# Altium footprint library Miscellaneous SMD.PcbLib: 82 footprints (part 5 of 7)
Each footprint in its own frame and in the unit in brackets; x right, y up, seen from the top. Pads: shape width x height; smd on the part's side, far side on the other; paste and mask are expansions set on the pad; w line width, h text height; cw(c..) or ccw(c..) is an arc to the next point about the centre after c.
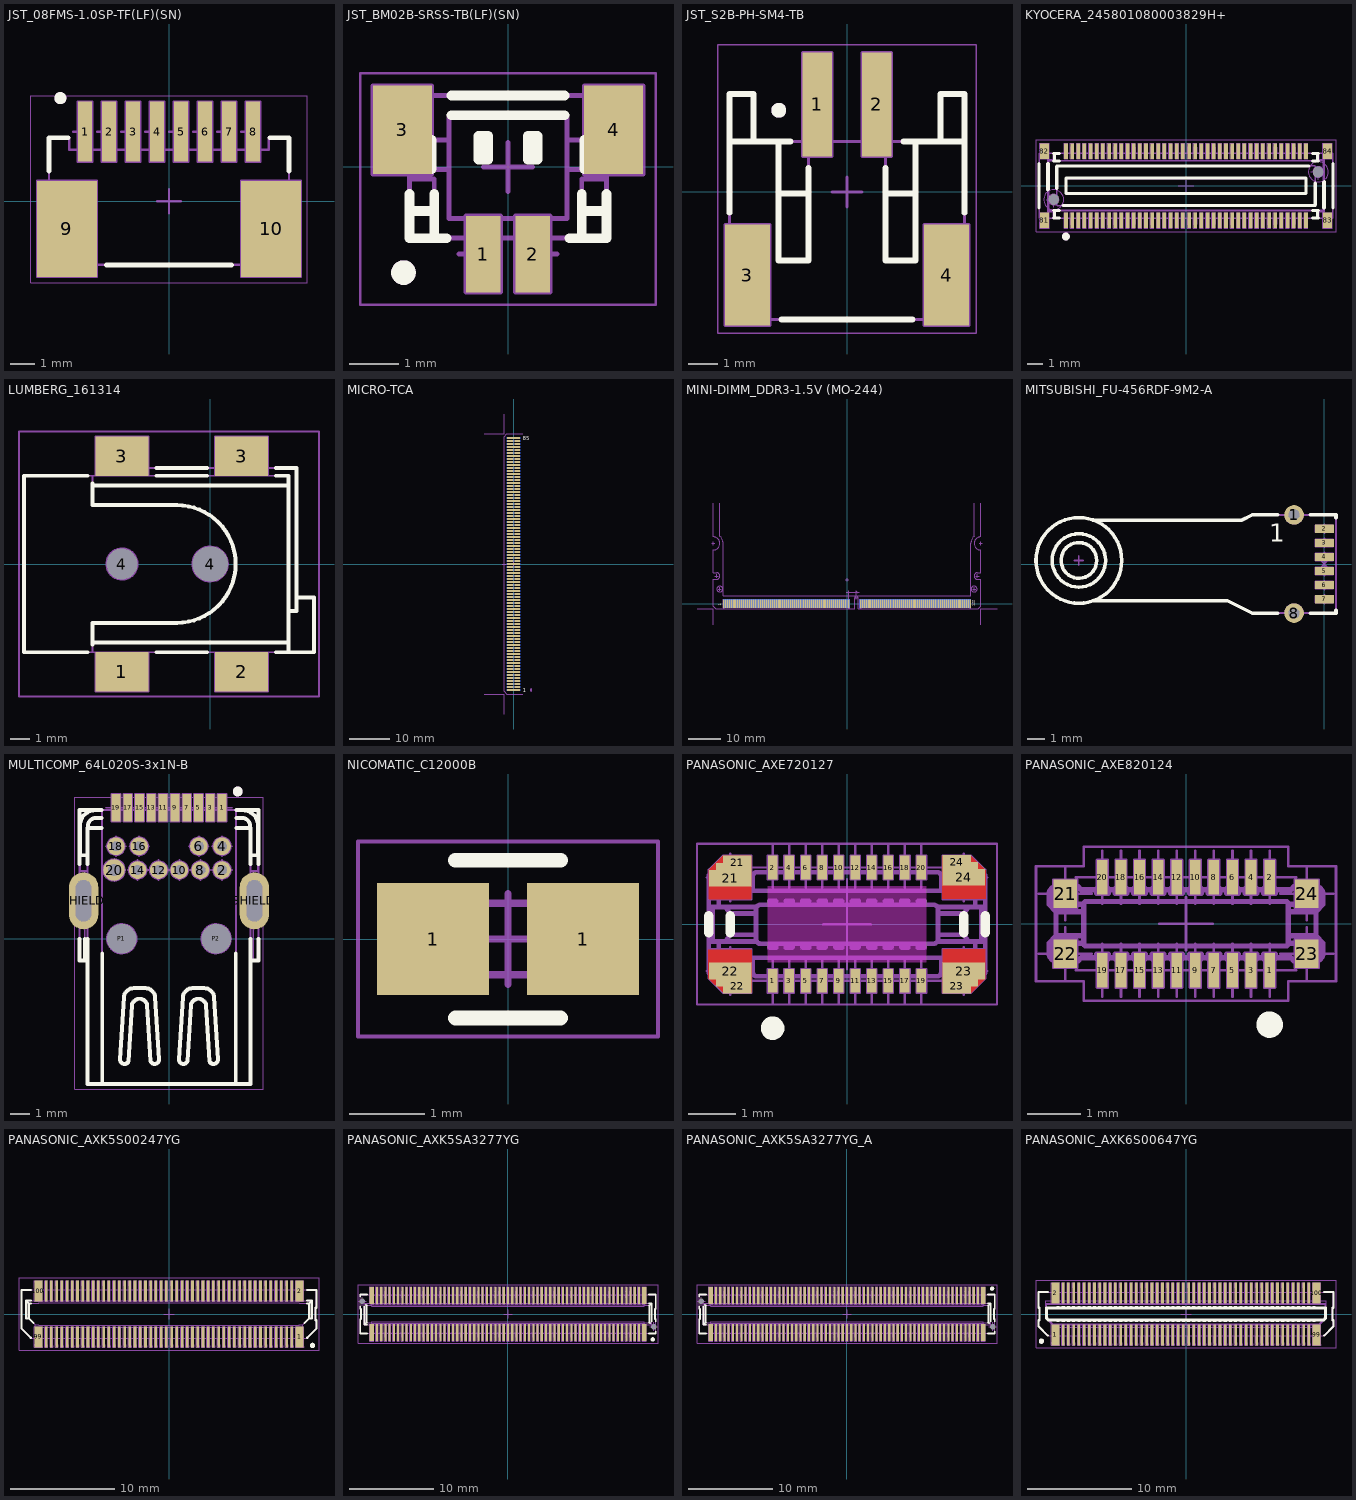
[diagram p4: the footprints below, top view; thin cyan lines are the x and y axes]

## JST_08FMS-1.0SP-TF(LF)(SN) [mm] "1.0mm Pitch, 8 Contacts, FSM Connector for FCC, Body 10mm x 5.3mm"
height 2.8
pads (10):
  rect 0.6x2.5 smd: 1(-3.5,2.9) 2(-2.5,2.9) 3(-1.5,2.9) 4(-0.5,2.9) 5(0.5,2.9) 6(1.5,2.9) 7(2.5,2.9) 8(3.5,2.9)
  rect 2.5x4 smd: 9(-4.25,-1.15) 10(4.25,-1.15)
Top Overlay:
  circle w0.25: c-4.525,4.3 r0.125
  lines w0.2: -5,1.25 -5,2.65 -4.2,2.65 ; -2.6,-2.65 2.6,-2.65 ; 4.2,2.65 5,2.65 5,1.25
Mechanical 8:
  lines w0.1: -4.75,-1.15 -4.25,-1.15 ; -4.25,-1.65 -4.25,-1.15 ; -4.25,-0.65 -4.25,-1.15 ; -4,2.9 -3.5,2.9 ; -3.75,-1.15 -4.25,-1.15 ; -3.5,2.4 -3.5,2.9 ; -3.5,3.4 -3.5,2.9 ; -3,2.9 -2.5,2.9 ; -2.5,2.4 -2.5,2.9 ; -2.5,3.4 -2.5,2.9 ; -2,2.9 -1.5,2.9 ; -1.5,2.4 -1.5,2.9 ; -1.5,3.4 -1.5,2.9 ; -1,2.9 -0.5,2.9 ; -0.5,0 0,0 ; -0.5,2.4 -0.5,2.9 ; -0.5,3.4 -0.5,2.9 ; 0,-0.5 0,0 ; 0,0.5 0,0 ; 0,2.9 0.5,2.9 ; 0.5,0 0,0 ; 0.5,2.4 0.5,2.9 ; 0.5,3.4 0.5,2.9 ; 1,2.9 1.5,2.9 ; 1.5,2.4 1.5,2.9 ; 1.5,3.4 1.5,2.9 ; 2,2.9 2.5,2.9 ; 2.5,2.4 2.5,2.9 ; 2.5,3.4 2.5,2.9 ; 3,2.9 3.5,2.9 ; 3.5,2.4 3.5,2.9 ; 3.5,3.4 3.5,2.9 ; 3.75,-1.15 4.25,-1.15 ; 4.25,-1.65 4.25,-1.15 ; 4.25,-0.65 4.25,-1.15 ; 4.75,-1.15 4.25,-1.15 ; -5.5,-3.15 -3,-3.15 -3,0.85 -5.5,0.85 -5.5,-3.15 ; -3.8,1.65 -3.8,4.15 -3.2,4.15 -3.2,1.65 -3.8,1.65 ; -2.8,1.65 -2.8,4.15 -2.2,4.15 -2.2,1.65 -2.8,1.65 ; -1.8,1.65 -1.8,4.15 -1.2,4.15 -1.2,1.65 -1.8,1.65 ; -0.8,1.65 -0.8,4.15 -0.2,4.15 -0.2,1.65 -0.8,1.65 ; 0.2,1.65 0.2,4.15 0.8,4.15 0.8,1.65 0.2,1.65 ; 1.2,1.65 1.2,4.15 1.8,4.15 1.8,1.65 1.2,1.65 ; 2.2,1.65 2.2,4.15 2.8,4.15 2.8,1.65 2.2,1.65 ; 3,-3.15 5.5,-3.15 5.5,0.85 3,0.85 3,-3.15 ; 3.2,1.65 3.2,4.15 3.8,4.15 3.8,1.65 3.2,1.65
Mechanical 14:
  circle w0.25: c-4.525,4.3 r0.125
  lines w0.1: -5,0.35 -3.5,0.35 -3.5,-2.65 ; -3.65,2.15 -3.65,3.65 -3.35,3.65 -3.35,2.15 ; -2.65,2.15 -2.65,3.65 -2.35,3.65 -2.35,2.15 ; -1.65,2.15 -1.65,3.65 -1.35,3.65 -1.35,2.15 ; -0.65,2.15 -0.65,3.65 -0.35,3.65 -0.35,2.15 ; 0.35,2.15 0.35,3.65 0.65,3.65 0.65,2.15 ; 1.35,2.15 1.35,3.65 1.65,3.65 1.65,2.15 ; 2.35,2.15 2.35,3.65 2.65,3.65 2.65,2.15 ; 3.35,2.15 3.35,3.65 3.65,3.65 3.65,2.15 ; 3.5,-2.65 3.5,0.35 5,0.35 ; -5,-2.65 5,-2.65 5,2.65 4.15,2.65 4.15,2.15 -4.15,2.15 -4.15,2.65 -5,2.65 -5,-2.65
Mechanical 15:
  lines w0.05: -5.75,-3.4 5.75,-3.4 5.75,4.4 -5.75,4.4 -5.75,-3.4
3D body "JST_08FMS-1.0SP-TF(LF)(SN).stp": height 2.8, standoff 0, extent -5,-2.65 5,3.65

## JST_BM02B-SRSS-TB(LF)(SN) [mm] "1.0mm Pitch Disconnectable Crimp Style Connector, Body 4mm x 2.9mm"
height 4.25
pads (4):
  rect 0.7x1.55 smd: 1(-0.5,-1.775) 2(0.5,-1.775)
  rect 1.2x1.8 smd: 3(-2.15,0.75) 4(2.15,0.75)
Top Overlay:
  circle w0.25: c-2.125,-2.15 r0.125
  lines w0.2: -2,-0.9 -1.5,-0.9 ; -2,-0.55 -2,-1.45 -1.25,-1.45 ; -1.55,-0.05 -1.55,0.55 ; -1.5,-1.45 -1.5,-0.55 ; -1.15,1.05 1.15,1.05 ; -1.15,1.45 1.15,1.45 ; -0.6,0.28 -0.4,0.28 ; 0.4,0.28 0.6,0.28 ; 1.25,-1.45 2,-1.45 2,-0.55 ; 1.5,-1.45 1.5,-0.55 ; 1.5,-0.9 2,-0.9 ; 1.55,-0.05 1.55,0.55 ; -0.6,0.15 -0.4,0.15 -0.4,0.63 -0.6,0.63 -0.6,0.15 ; 0.4,0.15 0.6,0.15 0.6,0.63 0.4,0.63 0.4,0.15
Mechanical 8:
  lines w0.1: -2.65,0.75 -2.15,0.75 ; -2.15,0.25 -2.15,0.75 ; -2.15,1.25 -2.15,0.75 ; -1.65,0.75 -2.15,0.75 ; -1,-1.775 -0.5,-1.775 ; -0.5,-2.275 -0.5,-1.775 ; -0.5,-1.275 -0.5,-1.775 ; -0.5,0 0,0 ; 0,-0.5 0,0 ; 0,0.5 0,0 ; 0.5,-2.275 0.5,-1.775 ; 0.5,-1.275 0.5,-1.775 ; 0.5,0 0,0 ; 1,-1.775 0.5,-1.775 ; 1.65,0.75 2.15,0.75 ; 2.15,0.25 2.15,0.75 ; 2.15,1.25 2.15,0.75 ; 2.65,0.75 2.15,0.75 ; -2.75,-0.15 -2.75,1.65 -1.55,1.65 -1.55,-0.15 -2.75,-0.15 ; -0.85,-2.55 -0.85,-1 -0.15,-1 -0.15,-2.55 -0.85,-2.55 ; 0.15,-2.55 0.15,-1 0.85,-1 0.85,-2.55 0.15,-2.55 ; 1.55,-0.15 1.55,1.65 2.75,1.65 2.75,-0.15 1.55,-0.15
Mechanical 14:
  circle w0.25: c-2.125,-2.15 r0.125
  lines w0.1: -2,-0.9 -1.5,-0.9 ; -2,-0.25 -1.5,-0.25 -1.5,-1.45 ; -1.2,-0.05 -1.55,-0.05 -1.55,0.55 -1.2,0.55 ; -0.6,-1.45 -0.6,-2.15 -0.4,-2.15 -0.4,-1.45 ; -0.6,0.28 -0.4,0.28 ; 0.4,-1.45 0.4,-2.15 0.6,-2.15 0.6,-1.45 ; 0.4,0.28 0.6,0.28 ; 1.2,-0.05 1.55,-0.05 1.55,0.55 1.2,0.55 ; 1.5,-1.45 1.5,-0.25 2,-0.25 ; 1.5,-0.9 2,-0.9 ; -2,-1.45 -2,1.45 2,1.45 2,-1.45 -2,-1.45 ; -1.2,-1.05 -1.2,1.05 1.2,1.05 1.2,-1.05 -1.2,-1.05 ; -0.6,0.15 -0.4,0.15 -0.4,0.63 -0.6,0.63 -0.6,0.15 ; 0.4,0.15 0.6,0.15 0.6,0.63 0.4,0.63 0.4,0.15
Mechanical 15:
  lines w0.05: -3,-2.8 3,-2.8 3,1.9 -3,1.9 -3,-2.8
3D body "JST_BM02B-SRSS-TB(LF)(SN).stp": height 4.32, standoff 0, extent -2,-2.15 2,1.45

## JST_S2B-PH-SM4-TB [mm] "2.0mm Pitch Disconnectable Crimp Style Connector, Body 7.9mm x 8.6mm"
height 5.5
pads (4):
  rect 1x3.5 smd: 1(-1,2.95) 2(1,2.95)
  rect 1.5x3.4 smd: 3(-3.35,-2.8) 4(3.35,-2.8)
Top Overlay:
  circle w0.25: c-2.3,2.75 r0.125
  lines w0.2: -3.95,-0.7 -3.95,3.3 -3.15,3.3 -3.15,1.7 ; -3.95,1.7 -1.9,1.7 ; -2.3,-0.05 -1.3,-0.05 ; -2.3,1.7 -2.3,-2.3 -1.3,-2.3 -1.3,0.8 ; -2.2,-4.3 2.2,-4.3 ; 1.3,-0.05 2.3,-0.05 ; 1.3,0.8 1.3,-2.3 2.3,-2.3 2.3,1.7 ; 1.9,1.7 3.95,1.7 ; 3.15,1.7 3.15,3.3 3.95,3.3 3.95,-0.7
Mechanical 8:
  lines w0.1: -3.85,-2.8 -3.35,-2.8 ; -3.35,-3.3 -3.35,-2.8 ; -3.35,-2.3 -3.35,-2.8 ; -2.85,-2.8 -3.35,-2.8 ; -1.5,2.95 -1,2.95 ; -1,2.45 -1,2.95 ; -1,3.45 -1,2.95 ; -0.5,0 0,0 ; -0.5,2.95 -1,2.95 ; 0,-0.5 0,0 ; 0,0.5 0,0 ; 0.5,0 0,0 ; 0.5,2.95 1,2.95 ; 1,2.45 1,2.95 ; 1,3.45 1,2.95 ; 1.5,2.95 1,2.95 ; 2.85,-2.8 3.35,-2.8 ; 3.35,-3.3 3.35,-2.8 ; 3.35,-2.3 3.35,-2.8 ; 3.85,-2.8 3.35,-2.8 ; -4.1,-4.5 -2.6,-4.5 -2.6,-1.1 -4.1,-1.1 -4.1,-4.5 ; -1.5,1.2 -1.5,4.7 -0.5,4.7 -0.5,1.2 -1.5,1.2 ; 0.5,1.2 0.5,4.7 1.5,4.7 1.5,1.2 0.5,1.2 ; 2.6,-4.5 4.1,-4.5 4.1,-1.1 2.6,-1.1 2.6,-4.5
Mechanical 14:
  circle w0.25: c-2.3,2.75 r0.125
  lines w0.1: -3.95,1.7 3.95,1.7 ; -3.45,-3.5 -3.45,-4.3 3.45,-4.3 3.45,-3.5 ; -3.15,1.7 -3.15,3.3 -3.95,3.3 -3.95,-3.5 -3.05,-3.5 -3.05,-4.3 ; -2.3,-0.05 -1.3,-0.05 ; -2.3,1.7 -2.3,-2.3 -1.3,-2.3 -1.3,1.7 ; -1.25,1.7 -1.25,4.3 -0.75,4.3 -0.75,1.7 ; 0.75,1.7 0.75,4.3 1.25,4.3 1.25,1.7 ; 1.3,-0.05 2.3,-0.05 ; 1.3,1.7 1.3,-2.3 2.3,-2.3 2.3,1.7 ; 3.05,-4.3 3.05,-3.5 3.95,-3.5 3.95,3.3 3.15,3.3 3.15,1.7
Mechanical 15:
  lines w0.05: -4.35,-4.75 -4.35,4.95 4.35,4.95 4.35,-4.75 -4.35,-4.75
3D body "JST_S2B-PH-SM4-TB.stp": height 5.6, standoff 0, extent -3.95,-4.3 3.95,4.3

## KYOCERA_245801080003829H+ [mm] "80 Contacts, Receptacle Vertical SMT, 0.4mm Pitch Board to Board Connector, With Metal Tab and Boss, 5801 Series"
height 0.85
pads (86):
  rect 0.23x1 smd: 1(-7.8,-2.25) 2(-7.8,2.25) 3(-7.4,-2.25) 4(-7.4,2.25) 5(-7,-2.25) 6(-7,2.25) 7(-6.6,-2.25) 8(-6.6,2.25) 9(-6.2,-2.25) 10(-6.2,2.25) 11(-5.8,-2.25) 12(-5.8,2.25) 13(-5.4,-2.25) 14(-5.4,2.25) 15(-5,-2.25) 16(-5,2.25) 17(-4.6,-2.25) 18(-4.6,2.25) 19(-4.2,-2.25) 20(-4.2,2.25) 21(-3.8,-2.25) 22(-3.8,2.25) 23(-3.4,-2.25) 24(-3.4,2.25) 25(-3,-2.25) 26(-3,2.25) 27(-2.6,-2.25) 28(-2.6,2.25) 29(-2.2,-2.25) 30(-2.2,2.25) 31(-1.8,-2.25) 32(-1.8,2.25) 33(-1.4,-2.25) 34(-1.4,2.25) 35(-1,-2.25) 36(-1,2.25) 37(-0.6,-2.25) 38(-0.6,2.25) 39(-0.2,-2.25) 40(-0.2,2.25) 41(0.2,-2.25) 42(0.2,2.25) 43(0.6,-2.25) 44(0.6,2.25) 45(1,-2.25) 46(1,2.25) 47(1.4,-2.25) 48(1.4,2.25) 49(1.8,-2.25) 50(1.8,2.25) 51(2.2,-2.25) 52(2.2,2.25) 53(2.6,-2.25) 54(2.6,2.25) 55(3,-2.25) 56(3,2.25) 57(3.4,-2.25) 58(3.4,2.25) 59(3.8,-2.25) 60(3.8,2.25) 61(4.2,-2.25) 62(4.2,2.25) 63(4.6,-2.25) 64(4.6,2.25) 65(5,-2.25) 66(5,2.25) 67(5.4,-2.25) 68(5.4,2.25) 69(5.8,-2.25) 70(5.8,2.25) 71(6.2,-2.25) 72(6.2,2.25) 73(6.6,-2.25) 74(6.6,2.25) 75(7,-2.25) 76(7,2.25) 77(7.4,-2.25) 78(7.4,2.25) 79(7.8,-2.25) 80(7.8,2.25)
  rect 0.6x1 smd: 81(-9.2,-2.25) 82(-9.2,2.25) 83(9.2,-2.25) 84(9.2,2.25)
  round 0.5 hole 0.7 unplated mask+0.1: P1(-8.6,-0.9) P2(8.6,0.9)
Top Overlay:
  circle w0.25: c-7.8,-3.3 r0.125
  lines w0.2: -9.55,-1.45 -9.55,1.45 ; -8.995,-0.284 -8.995,1.45 ; -8.925,-0.237 -8.925,1.45 ; -8.6,-2.1 -8.215,-2.1 ; -8.6,-1.61 -8.215,-1.61 ; -8.6,1.61 -8.215,1.61 ; -8.6,2.1 -8.215,2.1 ; -8.55,-2.1 -8.55,-1.61 ; -8.55,1.61 -8.55,2.1 ; -8.4,-0.182 -8.4,1.24 cw(c-8.35,1.24) -8.35,1.29 7.98,1.29 ; -7.98,-1.29 8.35,-1.29 ccw(c8.348,-1.238) 8.4,-1.24 8.4,0.182 ; 8.215,-2.1 8.6,-2.1 ; 8.215,-1.61 8.6,-1.61 ; 8.215,1.61 8.6,1.61 ; 8.215,2.1 8.6,2.1 ; 8.55,-2.1 8.55,-1.61 ; 8.55,1.61 8.55,2.1 ; 8.925,-1.45 8.925,0.237 ; 8.995,-1.45 8.995,0.284 ; 9.55,-1.45 9.55,1.45 ; -7.8,-0.51 -7.8,0.51 7.8,0.51 7.8,-0.51 -7.8,-0.51
Mechanical 8:
  drawing of 516 lines, arcs and shapes, not listed
  text "79" at 7.616,-2.375 h0.2
  text "77" at 7.225,-2.375 h0.2
  text "78" at 7.225,2.125 h0.2
  text "80" at 7.625,2.125 h0.2
  text "4" at -7.5,2.125 h0.2
  text "2" at -7.892,2.125 h0.2
  text "3" at -7.493,-2.375 h0.2
  text "1" at -7.862,-2.375 h0.2
Mechanical 14:
  drawing of 297 lines, arcs and shapes, not listed
Mechanical 15:
  lines w0.05: -9.75,-3 -9.75,3 9.75,3 9.75,-3 -9.75,-3
3D body "KYOCERA_245801080003829H+.stp": height 0.75, standoff -0.33, extent -9.55,-2.5 9.55,2.5

## LUMBERG_161314 [mm] "Right Angle Surface Mount Power Supply Chassis Socket With Break Contacts"
height 11
pads (6):
  rect 2.7x2 smd: 1(-4.5,-5.5) 2(1.6,-5.5) 3(-4.5,5.5) 3(1.6,5.5)
  round 1 hole 1.6 unplated mask+0.3: 4(-4.5,0)
  round 1 hole 1.8 unplated mask+0.4: 4(0,0)
Top Overlay:
  lines w0.2: -6.25,-4.5 -9.5,-4.5 -9.5,4.5 -6.25,4.5 ; -6,-4.1 -6,-3 -1.7,-3 ccw(c-1.7,0) -1.7,3 -6,3 -6,4.1 ; -6,-4 4,-4 ; -6,4 4,4 ; -2.75,-4.5 -0.15,-4.5 ; -2.75,4.5 -0.15,4.5 ; -2.75,4.9 -0.15,4.9 ; 3.35,-4.5 4,-4.5 ; 3.35,4.5 4,4.5 4,-4.5 ; 3.35,4.9 4.4,4.9 4.4,-2.4 4,-2.4 ; 4.4,-1.7 5.3,-1.7 5.3,-4.5 4,-4.5
Mechanical 8:
  circle w0.1: c0,0 r0.9
  circle w0.1: c-4.5,0 r0.8
  lines w0.1: -5,-5.5 -4.5,-5.5 ; -5,0 -4.5,0 ; -5,5.5 -4.5,5.5 ; -4.5,-6 -4.5,-5.5 ; -4.5,-5 -4.5,-5.5 ; -4.5,-0.5 -4.5,0 ; -4.5,0.5 -4.5,0 ; -4.5,5 -4.5,5.5 ; -4.5,6 -4.5,5.5 ; -4,-5.5 -4.5,-5.5 ; -4,0 -4.5,0 ; -4,5.5 -4.5,5.5 ; -0.5,0 0,0 ; 0,-0.5 0,0 ; 0,0.5 0,0 ; 0.5,0 0,0 ; 1.1,-5.5 1.6,-5.5 ; 1.1,5.5 1.6,5.5 ; 1.6,-6 1.6,-5.5 ; 1.6,-5 1.6,-5.5 ; 1.6,5 1.6,5.5 ; 1.6,6 1.6,5.5 ; 2.1,-5.5 1.6,-5.5 ; 2.1,5.5 1.6,5.5 ; -5.85,-6.5 -5.85,-4.5 -3.15,-4.5 -3.15,-6.5 -5.85,-6.5 ; -5.85,4.5 -3.15,4.5 -3.15,6.5 -5.85,6.5 -5.85,4.5 ; 0.25,-6.5 2.95,-6.5 2.95,-4.5 0.25,-4.5 0.25,-6.5 ; 0.25,4.5 2.95,4.5 2.95,6.5 0.25,6.5 0.25,4.5
Mechanical 14:
  lines w0.1: -6,-4.5 -6,-3 -1.7,-3 ccw(c-1.7,0) -1.7,3 -6,3 -6,4.5 ; -6,-4 4,-4 ; -6,4 4,4 ; -5.25,-4.9 -3.75,-4.9 ; -5.25,-4.5 -5.25,-6.3 -3.75,-6.3 -3.75,-4.5 ; -5.25,4.5 -5.25,6.3 -3.75,6.3 -3.75,4.9 ; -5.25,4.9 4.4,4.9 4.4,-2.4 4,-2.4 ; 0.85,-4.9 2.35,-4.9 ; 0.85,-4.5 0.85,-6.3 2.35,-6.3 2.35,-4.5 ; 0.85,4.9 0.85,6.3 2.35,6.3 2.35,4.9 ; 4.4,-1.7 5.3,-1.7 5.3,-4.5 4,-4.5 ; 4,-4.5 -9.5,-4.5 -9.5,4.5 4,4.5 4,-4.5
Mechanical 15:
  lines w0.1: -9.75,-6.75 -9.75,6.75 5.55,6.75 5.55,-6.75 -9.75,-6.75
3D body "LUMBERG_161314.stp": height 11, standoff -1.2, extent -9.5,-6.3 5.3,6.3

## MICRO-TCA [mm] "170 Contact Board Edge Connector,  Micro TCA (Telecom Computing Architecture)"
pads (285):
  rect 3.3x0.48 smd paste-3.3: 1(0,-31.5) 7(0,-27) 10(0,-24.75) 13(0,-22.5) 16(0,-20.25) 19(0,-18) 22(0,-15.75) 25(0,-13.5) 28(0,-11.25) 31(0,-9) 34(0,-6.75) 37(0,-4.5) 40(0,-2.25) 43(0,0) 46(0,2.25) 49(0,4.5) 52(0,6.75) 55(0,9) 58(0,11.25) 61(0,13.5) 64(0,15.75) 67(0,18) 70(0,20.25) 73(0,22.5) 76(0,24.75) 79(0,27) 82(0,29.25) 85(0,31.5)
  rect 1.4x0.48 smd paste-1.4: 2(0.95,-30.75) 3(0.95,-30) 4(0.95,-29.25) 5(0.95,-28.5) 6(0.95,-27.75) 8(0.95,-26.25) 9(0.95,-25.5) 11(0.95,-24) 12(0.95,-23.25) 14(0.95,-21.75) 15(0.95,-21) 17(0.95,-19.5) 18(0.95,-18.75) 20(0.95,-17.25) 21(0.95,-16.5) 23(0.95,-15) 24(0.95,-14.25) 26(0.95,-12.75) 27(0.95,-12) 29(0.95,-10.5) 30(0.95,-9.75) 32(0.95,-8.25) 33(0.95,-7.5) 35(0.95,-6) 36(0.95,-5.25) 38(0.95,-3.75) 39(0.95,-3) 41(0.95,-1.5) 42(0.95,-0.75) 44(0.95,0.75) 45(0.95,1.5) 47(0.95,3) 48(0.95,3.75) 50(0.95,5.25) 51(0.95,6) 53(0.95,7.5) 54(0.95,8.25) 56(0.95,9.75) 57(0.95,10.5) 59(0.95,12) 60(0.95,12.75) 62(0.95,14.25) 63(0.95,15) 65(0.95,16.5) 66(0.95,17.25) 68(0.95,18.75) 69(0.95,19.5) 71(0.95,21) 72(0.95,21.75) 74(0.95,23.25) 75(0.95,24) 77(0.95,25.5) 78(0.95,26.25) 80(0.95,27.75) 81(0.95,28.5) 83(0.95,30) 84(0.95,30.75)
  rect 1.7x0.48 smd paste-1.7: 3mate(-0.8,-30.75) 3mate(-0.8,-30) 3mate(-0.8,-29.25) 3mate(-0.8,-28.5) 3mate(-0.8,-27.75) 3mate(-0.8,-26.25) 3mate(-0.8,-25.5) 3mate(-0.8,-24) 3mate(-0.8,-23.25) 3mate(-0.8,-21.75) 3mate(-0.8,-21) 3mate(-0.8,-19.5) 3mate(-0.8,-18.75) 3mate(-0.8,-17.25) 3mate(-0.8,-16.5) 3mate(-0.8,-15) 3mate(-0.8,-14.25) 3mate(-0.8,-12.75) 3mate(-0.8,-12) 3mate(-0.8,-10.5) 3mate(-0.8,-9.75) 3mate(-0.8,-8.25) 3mate(-0.8,-7.5) 3mate(-0.8,-6) 3mate(-0.8,-5.25) 3mate(-0.8,-3.75) 3mate(-0.8,-3) 3mate(-0.8,-1.5) 3mate(-0.8,-0.75) 3mate(-0.8,0.75) 3mate(-0.8,1.5) 3mate(-0.8,3) 3mate(-0.8,3.75) 3mate(-0.8,5.25) 3mate(-0.8,6) 3mate(-0.8,7.5) 3mate(-0.8,8.25) 3mate(-0.8,9.75) 3mate(-0.8,10.5) 3mate(-0.8,12) 3mate(-0.8,12.75) 3mate(-0.8,14.25) 3mate(-0.8,15) 3mate(-0.8,16.5) 3mate(-0.8,17.25) 3mate(-0.8,18.75) 3mate(-0.8,19.5) 3mate(-0.8,21) 3mate(-0.8,21.75) 3mate(-0.8,23.25) 3mate(-0.8,24) 3mate(-0.8,25.5) 3mate(-0.8,26.25) 3mate(-0.8,27.75) 3mate(-0.8,28.5) 3mate(-0.8,30) 3mate(-0.8,30.75)
  rect 1.7x0.48 smd far side paste-1.7: 3mate(-0.8,-30.75) 3mate(-0.8,-30) 3mate(-0.8,-29.25) 3mate(-0.8,-28.5) 3mate(-0.8,-27.75) 3mate(-0.8,-26.25) 3mate(-0.8,-25.5) 3mate(-0.8,-24) 3mate(-0.8,-23.25) 3mate(-0.8,-21.75) 3mate(-0.8,-21) 3mate(-0.8,-19.5) 3mate(-0.8,-18.75) 3mate(-0.8,-17.25) 3mate(-0.8,-16.5) 3mate(-0.8,-15) 3mate(-0.8,-14.25) 3mate(-0.8,-12.75) 3mate(-0.8,-12) 3mate(-0.8,-10.5) 3mate(-0.8,-9.75) 3mate(-0.8,-8.25) 3mate(-0.8,-7.5) 3mate(-0.8,-6) 3mate(-0.8,-5.25) 3mate(-0.8,-3.75) 3mate(-0.8,-3) 3mate(-0.8,-1.5) 3mate(-0.8,-0.75) 3mate(-0.8,0.75) 3mate(-0.8,1.5) 3mate(-0.8,3) 3mate(-0.8,3.75) 3mate(-0.8,5.25) 3mate(-0.8,6) 3mate(-0.8,7.5) 3mate(-0.8,8.25) 3mate(-0.8,9.75) 3mate(-0.8,10.5) 3mate(-0.8,12) 3mate(-0.8,12.75) 3mate(-0.8,14.25) 3mate(-0.8,15) 3mate(-0.8,16.5) 3mate(-0.8,17.25) 3mate(-0.8,18.75) 3mate(-0.8,19.5) 3mate(-0.8,21) 3mate(-0.8,21.75) 3mate(-0.8,23.25) 3mate(-0.8,24) 3mate(-0.8,25.5) 3mate(-0.8,26.25) 3mate(-0.8,27.75) 3mate(-0.8,28.5) 3mate(-0.8,30) 3mate(-0.8,30.75)
  rect 3.3x0.48 smd far side paste-3.3: 86(0,31.5) 89(0,29.25) 92(0,27) 95(0,24.75) 98(0,22.5) 101(0,20.25) 104(0,18) 107(0,15.75) 110(0,13.5) 113(0,11.25) 116(0,9) 119(0,6.75) 122(0,4.5) 125(0,2.25) 128(0,0) 131(0,-2.25) 134(0,-4.5) 137(0,-6.75) 140(0,-9) 143(0,-11.25) 146(0,-13.5) 149(0,-15.75) 152(0,-18) 155(0,-20.25) 158(0,-22.5) 161(0,-24.75) 164(0,-27) 170(0,-31.5)
  rect 1.4x0.48 smd far side paste-1.4: 87(0.95,30.75) 88(0.95,30) 90(0.95,28.5) 91(0.95,27.75) 93(0.95,26.25) 94(0.95,25.5) 96(0.95,24) 97(0.95,23.25) 99(0.95,21.75) 100(0.95,21) 102(0.95,19.5) 103(0.95,18.75) 105(0.95,17.25) 106(0.95,16.5) 108(0.95,15) 109(0.95,14.25) 111(0.95,12.75) 112(0.95,12) 114(0.95,10.5) 115(0.95,9.75) 117(0.95,8.25) 118(0.95,7.5) 120(0.95,6) 121(0.95,5.25) 123(0.95,3.75) 124(0.95,3) 126(0.95,1.5) 127(0.95,0.75) 129(0.95,-0.75) 130(0.95,-1.5) 132(0.95,-3) 133(0.95,-3.75) 135(0.95,-5.25) 136(0.95,-6) 138(0.95,-7.5) 139(0.95,-8.25) 141(0.95,-9.75) 142(0.95,-10.5) 144(0.95,-12) 145(0.95,-12.75) 147(0.95,-14.25) 148(0.95,-15) 150(0.95,-16.5) 151(0.95,-17.25) 153(0.95,-18.75) 154(0.95,-19.5) 156(0.95,-21) 157(0.95,-21.75) 159(0.95,-23.25) 160(0.95,-24) 162(0.95,-25.5) 163(0.95,-26.25) 165(0.95,-27.75) 166(0.95,-28.5) 167(0.95,-29.25) 168(0.95,-30) 169(0.95,-30.75)
  rect 1.4x0.48 on Bottom Solder paste-1.4: 138(0.95,-7.5)
Top Overlay:
  text "85" at 2.271,30.961 h1
  text "1" at 2.271,-32.039 h1
Bottom Overlay:
  text "86" at 2.275,31.95 h1
  text "170" at 2.275,-31.05 h1
Top Solder:
  rectangle: -2.35,-32.5 2.35,32.5
Bottom Solder:
  rectangle: -2.35,-32.5 2.35,32.5
Mechanical 8:
  lines w0.1: -7.35,-32.5 -2.35,-32.5 -2.35,-37.5 ; -7.35,32.5 -2.35,32.5 -2.35,37.5 ; -2.85,0 -2.35,0 ; -1.85,0 -2.35,0 ; -0.5,0 0,0 ; 0,-0.5 0,0 ; 0,0.5 0,0 ; 0.5,0 0,0 ; 2.35,-32.5 -1.65,-32.5 -2.35,-31.8 -2.35,0 ; 2.35,32.5 -1.65,32.5 -2.35,31.8 -2.35,0
  text "PCB Edge" at -3.05,-4.075 h1
Mechanical 15:
  circle w0.01: c4.4,-31.5 r0.2
  lines w0.01: 4.4,-31.9 4.4,-31.1

## MINI-DIMM_DDR3-1.5V (MO-244) [mm] "Mini DIMM 244 Contacts (DDR3 1.5V Mechanical Keying) Board Edge Connector (JEDEC MO-244)"
pads (244):
  rect 0.45x2.55 smd: 1(-37.8,0) 2(-37.2,0) 3(-36.6,0) 4(-36,0) 5(-35.4,0) 6(-34.8,0) 7(-34.2,0) 8(-33.6,0) 9(-33,0) 10(-32.4,0) 11(-31.8,0) 12(-31.2,0) 13(-30.6,0) 14(-30,0) 15(-29.4,0) 16(-28.8,0) 17(-28.2,0) 18(-27.6,0) 19(-27,0) 20(-26.4,0) 21(-25.8,0) 22(-25.2,0) 23(-24.6,0) 24(-24,0) 25(-23.4,0) 26(-22.8,0) 27(-22.2,0) 28(-21.6,0) 29(-21,0) 30(-20.4,0) 31(-19.8,0) 32(-19.2,0) 33(-18.6,0) 34(-18,0) 35(-17.4,0) 36(-16.8,0) 37(-16.2,0) 38(-15.6,0) 39(-15,0) 40(-14.4,0) 41(-13.8,0) 42(-13.2,0) 43(-12.6,0) 44(-12,0) 45(-11.4,0) 46(-10.8,0) 47(-10.2,0) 48(-9.6,0) 49(-9,0) 50(-8.4,0) 51(-7.8,0) 52(-7.2,0) 53(-6.6,0) 54(-6,0) 55(-5.4,0) 56(-4.8,0) 57(-4.2,0) 58(-3.6,0) 59(-3,0) 60(-2.4,0) 61(-1.8,0) 62(-1.2,0) 63(-0.6,0) 64(0,0) 65(0.6,0) 66(4.2,0) 67(4.8,0) 68(5.4,0) 69(6,0) 70(6.6,0) 71(7.2,0) 72(7.8,0) 73(8.4,0) 74(9,0) 75(9.6,0) 76(10.2,0) 77(10.8,0) 78(11.4,0) 79(12,0) 80(12.6,0) 81(13.2,0) 82(13.8,0) 83(14.4,0) 84(15,0) 85(15.6,0) 86(16.2,0) 87(16.8,0) 88(17.4,0) 89(18,0) 90(18.6,0) 91(19.2,0) 92(19.8,0) 93(20.4,0) 94(21,0) 95(21.6,0) 96(22.2,0) 97(22.8,0) 98(23.4,0) 99(24,0) 100(24.6,0) 101(25.2,0) 102(25.8,0) 103(26.4,0) 104(27,0) 105(27.6,0) 106(28.2,0) 107(28.8,0) 108(29.4,0) 109(30,0) 110(30.6,0) 111(31.2,0) 112(31.8,0) 113(32.4,0) 114(33,0) 115(33.6,0) 116(34.2,0) 117(34.8,0) 118(35.4,0) 119(36,0) 120(36.6,0) 121(37.2,0) 122(37.8,0)
  rect 0.45x2.55 smd far side: 123(-37.8,0) 124(-37.2,0) 125(-36.6,0) 126(-36,0) 127(-35.4,0) 128(-34.8,0) 129(-34.2,0) 130(-33.6,0) 131(-33,0) 132(-32.4,0) 133(-31.8,0) 134(-31.2,0) 135(-30.6,0) 136(-30,0) 137(-29.4,0) 138(-28.8,0) 139(-28.2,0) 140(-27.6,0) 141(-27,0) 142(-26.4,0) 143(-25.8,0) 144(-25.2,0) 145(-24.6,0) 146(-24,0) 147(-23.4,0) 148(-22.8,0) 149(-22.2,0) 150(-21.6,0) 151(-21,0) 152(-20.4,0) 153(-19.8,0) 154(-19.2,0) 155(-18.6,0) 156(-18,0) 157(-17.4,0) 158(-16.8,0) 159(-16.2,0) 160(-15.6,0) 161(-15,0) 162(-14.4,0) 163(-13.8,0) 164(-13.2,0) 165(-12.6,0) 166(-12,0) 167(-11.4,0) 168(-10.8,0) 169(-10.2,0) 170(-9.6,0) 171(-9,0) 172(-8.4,0) 173(-7.8,0) 174(-7.2,0) 175(-6.6,0) 176(-6,0) 177(-5.4,0) 178(-4.8,0) 179(-4.2,0) 180(-3.6,0) 181(-3,0) 182(-2.4,0) 183(-1.8,0) 184(-1.2,0) 185(-0.6,0) 186(0,0) 187(0.6,0) 188(4.2,0) 189(4.8,0) 190(5.4,0) 191(6,0) 192(6.6,0) 193(7.2,0) 194(7.8,0) 195(8.4,0) 196(9,0) 197(9.6,0) 198(10.2,0) 199(10.8,0) 200(11.4,0) 201(12,0) 202(12.6,0) 203(13.2,0) 204(13.8,0) 205(14.4,0) 206(15,0) 207(15.6,0) 208(16.2,0) 209(16.8,0) 210(17.4,0) 211(18,0) 212(18.6,0) 213(19.2,0) 214(19.8,0) 215(20.4,0) 216(21,0) 217(21.6,0) 218(22.2,0) 219(22.8,0) 220(23.4,0) 221(24,0) 222(24.6,0) 223(25.2,0) 224(25.8,0) 225(26.4,0) 226(27,0) 227(27.6,0) 228(28.2,0) 229(28.8,0) 230(29.4,0) 231(30,0) 232(30.6,0) 233(31.2,0) 234(31.8,0) 235(32.4,0) 236(33,0) 237(33.6,0) 238(34.2,0) 239(34.8,0) 240(35.4,0) 241(36,0) 242(36.6,0) 243(37.2,0) 244(37.8,0)